# Altium footprint library 2.52-直插元件.PcbLib: 467 footprints (part 2 of 30)
Each footprint in its own frame and in the unit in brackets; x right, y up, seen from the top. Pads: shape width x height; smd on the part's side, far side on the other; paste and mask are expansions set on the pad; w line width, h text height; cw(c..) or ccw(c..) is an arc to the next point about the centre after c.
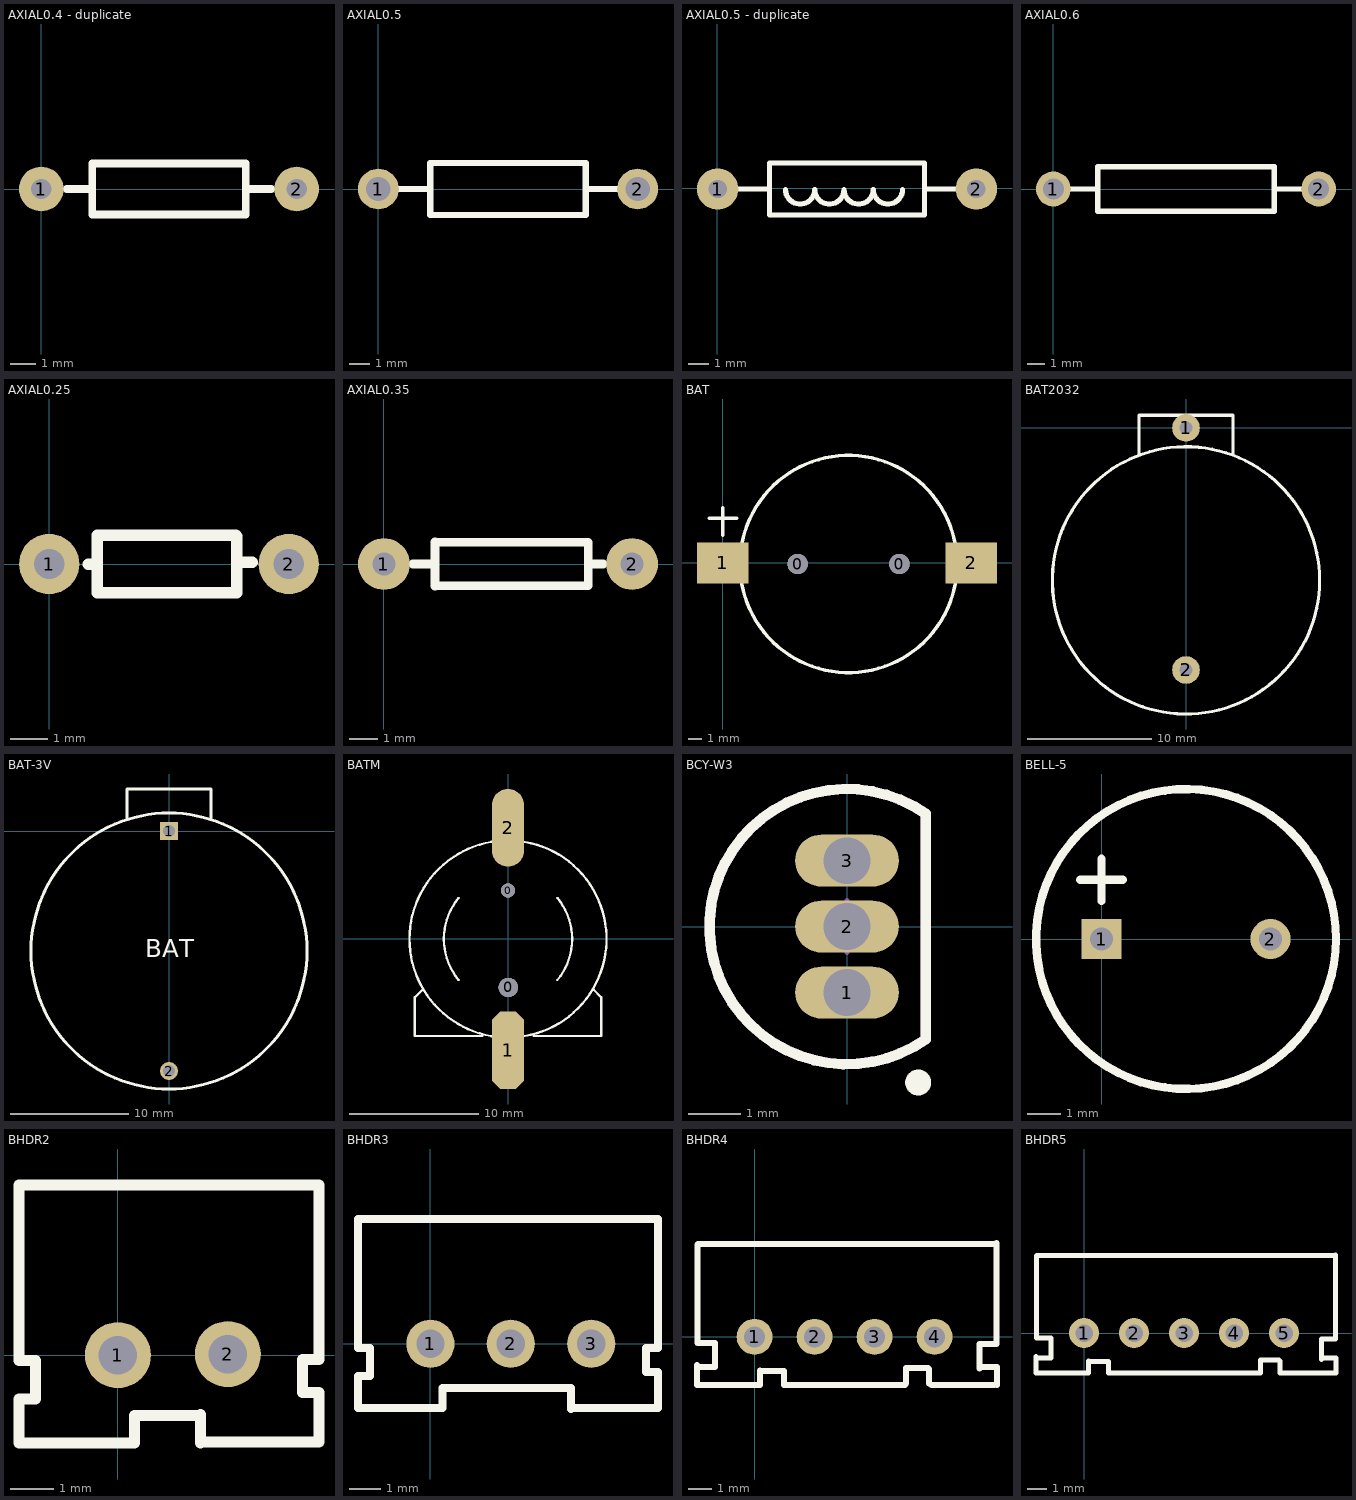
[diagram p1: the footprints below, top view; thin cyan lines are the x and y axes]

## AXIAL0.4 - duplicate [mil] "淘宝ID:黄晶宝石   店铺网址:https://shop463601444.taobao.com"
pads (2):
  round 70 hole 32: 1(0,0.11) 2(400,0.11)
Top Overlay:
  lines w12: 40,0.11 80,0.11 ; 320,0.11 360,0.11 ; 80,-39.89 320,-39.89 320,40.11 80,40.11 80,-39.89
3D body "SW3dPS-resistor - fixed.STEP": height 94, standoff -110, extent -13,-44 409,44

## AXIAL0.5 [mm]
pads (2):
  round 2 hole 1.2: 1(0,0) 2(12.7,0)
Top Overlay:
  lines w0.305: 1.016,0 2.54,0 ; 10.16,0 11.684,0 ; 2.54,-1.27 2.54,1.27 10.16,1.27 10.16,-1.27 2.54,-1.27

## AXIAL0.5 - duplicate [mil] "淘宝ID:黄晶宝石   店铺网址:https://shop463601444.taobao.com"
pads (2):
  round 80 hole 35.43: 1(0.49,-1.06) 2(500.49,-1.06)
Top Overlay:
  lines w10: 40.49,-1.06 100.49,-1.06 ; 131.58,-1.98 ccw(c159.87,-1.98) 188.15,-1.98 ccw(c216.44,-1.98) 244.72,-1.98 ccw(c273,-1.98) 301.29,-1.98 ccw(c329.57,-1.98) 357.86,-1.98 ; 400.49,-1.06 460.49,-1.06 ; 100.49,-51.06 400.49,-51.06 400.49,48.94 100.49,48.94 100.49,-51.06
3D body "User Library-Resistencia 0_5.STEP": height 19.68, standoff -161.56, extent -15,-58 515,54.5

## AXIAL0.6 [mm]
pads (2):
  round 2 hole 1.2: 1(0,0) 2(15.24,0)
Top Overlay:
  lines w0.305: 1.016,0 2.54,0 ; 12.7,0 14.224,0 ; 2.54,-1.27 2.54,1.27 12.7,1.27 12.7,-1.27 2.54,-1.27

## AXIAL0.25 [mm]
pads (2):
  round 1.6 hole 0.8: 1(0,0) 2(6.35,0)
Top Overlay:
  lines w0.3: 1.27,-0.762 4.974,-0.762 4.974,0.738 4.95,0.762 1.27,0.762
  lines w0.305: 1.041,0 1.27,0 ; 1.27,-0.762 1.27,0.762 ; 5.148,0.042 5.377,0.042

## AXIAL0.35 [mm]
pads (2):
  round 1.8 hole 0.8: 1(0,0) 2(8.636,0)
Top Overlay:
  lines w0.3: 1.778,-0.762 1.778,0.762 7.112,0.762 7.112,0 7.112,-0.762 1.778,-0.762
  lines w0.305: 1.016,0 1.778,0 ; 1.778,-0.762 1.778,0.762 ; 7.112,0 7.62,0

## BAT [mm]
pads (4):
  round 1.5 hole 1.5: 0(5.505,-0.076) 0(13.005,-0.076)
  rect 3.81x3.048 smd: 1(0,0) 2(18.288,0)
Top Overlay:
  circle w0.254: c9.255,-0.076 r8
  lines w0.254: -1.016,3.302 1.016,3.302 ; 0,2.032 0,4.064

## BAT2032 [mil]
pads (2):
  round 88 hole 40: 1(0,0) 2(0,-770)
Top Overlay:
  circle w10: c0,-485 r425
  lines w10: -150,-85 -150,40 0,40 150,40 150,-85

## BAT-3V [mil]
pads (2):
  rect 60x60 hole 40: 1(0,0)
  round 60 hole 40: 2(0,-800)
Top Overlay:
  circle w10: c0,-400 r460
  lines w10: -140,40 -140,140 140,140 140,40
  text "BAT" at -80,-420 h60

## BATM [mm]
pads (4):
  round 1.1 hole 1.1 unplated: 0(0,3.748)
  round 1.5 hole 1.5 unplated: 0(0.025,-3.752)
  oct 2.5x6 smd: 1(0,-8.602)
  oval 2.5x6 smd: 2(0,8.598)
Top Overlay:
  lines w0.178: -6.6,-3.902 -7.2,-4.502 -7.2,-7.502 -2,-7.502 ; -3.815,-3.171 cw(c0,-0.002) -3.812,3.171 ; -0.833,-7.576 cw(c0,-0.002) -7.62,-0.002 cw(c0,-0.002) -0.833,7.573 ; 0.833,-7.576 ccw(c0,-0.002) 0.833,7.573 ; 2,-7.502 7.2,-7.502 7.2,-4.502 6.625,-3.927 ; 3.81,-3.177 ccw(c0,-0.002) 3.812,3.171

## BCY-W3 [mm] "TO, Flat Index; 3 In-Line, Axial Leads; Body Dia. 4.8mm; Leads 0.55 x 0.51 mm (max)"
height 5.33
pads (3):
  oval 2x1 hole 0.9: 1(0,-1.27) 2(0,0) 3(0,1.27)
Top Overlay:
  circle w0.25: c1.371,-3.003 r0.125
  lines w0.2: 1.52,-2.171 cw(c0,0) 1.52,2.171 1.52,-2.171
Mechanical 13:
  lines w0.2: 1.52,-2.171 cw(c0,0) 1.52,2.171 1.52,-2.171
Mechanical 15:
  lines w0.1: -0.5,0 0.5,0 ; 0,-0.5 0,0.5
3D body: height 5.33, standoff 0, extent -2.651,-2.661 1.52,2.661

## BELL-5 [mm]
pads (2):
  rect 1.2x1.2 hole 0.7: 1(0,0)
  round 1.2 hole 0.7: 2(5.08,0)
Top Overlay:
  circle w0.254: c2.54,0 r4.51
  lines w0.254: -0.635,1.778 0.635,1.778 ; 0,1.143 0,2.413

## BHDR2 [mil]
pads (2):
  round 60 hole 35: 1(0,0) 2(100,1)
Top Overlay:
  lines w10: 75,-55 15,-55 15,-80 -90,-80 -90,-40 -75,-40 -75,-30 -75,-5 -90,-5 -90,155 183,155 183,-4 ; 75,-54 75,-80 76,-79 132,-79 ; 134,-79 95,-79 183,-79 183,-34 168,-34 168,-4 183,-4 ; 183,11 183,-4

## BHDR3 [mil]
pads (3):
  round 60 hole 35: 1(0,0) 2(100,0) 3(200,0)
Top Overlay:
  lines w10: 58,-55 158,-55 ; 85,-55 15,-55 15,-80 -90,-80 -90,-40 -75,-40 -75,-30 -75,-5 -90,-5 -90,155 195,155 283,155 283,-5 ; 124,-55 175,-55 175,-81 176,-80 232,-80 ; 234,-80 195,-80 283,-80 283,-35 268,-35 268,-5 283,-5 ; 283,10 283,-5

## BHDR4 [mil]
pads (4):
  round 60 hole 35: 1(0,0) 2(100,0) 3(200,0) 4(300,0)
Top Overlay:
  lines w10: -96,-50 -66,-50 -66,-10 -95,-10 -95,134 ; -96,-47 -96,-80 ; -95,-79 -96,-80 ; -95,103 -95,154 -94,155 -31,155 ; -73,155 93,155 364,155 ; 200,-80 248,-80 ; 251,-80 49,-80 49,-57 10,-57 9,-56 9,-80 -96,-80 ; 252,-78 252,-52 289,-52 291,-54 291,-78 ; 294,155 401,155 ; 295,-80 400,-80 ; 375,-53 375,-12 403,-12 403,156 ; 375,-50 404,-50 404,-80

## BHDR5 [mil]
pads (5):
  round 60 hole 35: 1(0,0) 2(100,0) 3(200,0) 4(300,0) 5(400,0)
Top Overlay:
  lines w10: -96,-50 -66,-50 -66,-10 -95,-10 -95,134 ; -96,-47 -96,-80 ; -95,-79 -96,-80 ; -95,103 -95,154 -94,155 -31,155 ; -73,155 93,155 ; 82,155 179,155 ; 175,155 341,155 ; 275,155 394,155 501,155 ; 390,-54 353,-54 353,-80 49,-80 49,-57 10,-57 9,-56 9,-80 -96,-80 ; 392,-80 392,-56 ; 395,-80 500,-80 ; 475,-53 475,-12 503,-12 503,156 ; 475,-50 504,-50 504,-80